# Altium footprint library General.PCBLIB: 231 footprints (part 5 of 15)
Each footprint in its own frame and in the unit in brackets; x right, y up, seen from the top. Pads: shape width x height; smd on the part's side, far side on the other; paste and mask are expansions set on the pad; w line width, h text height; cw(c..) or ccw(c..) is an arc to the next point about the centre after c.
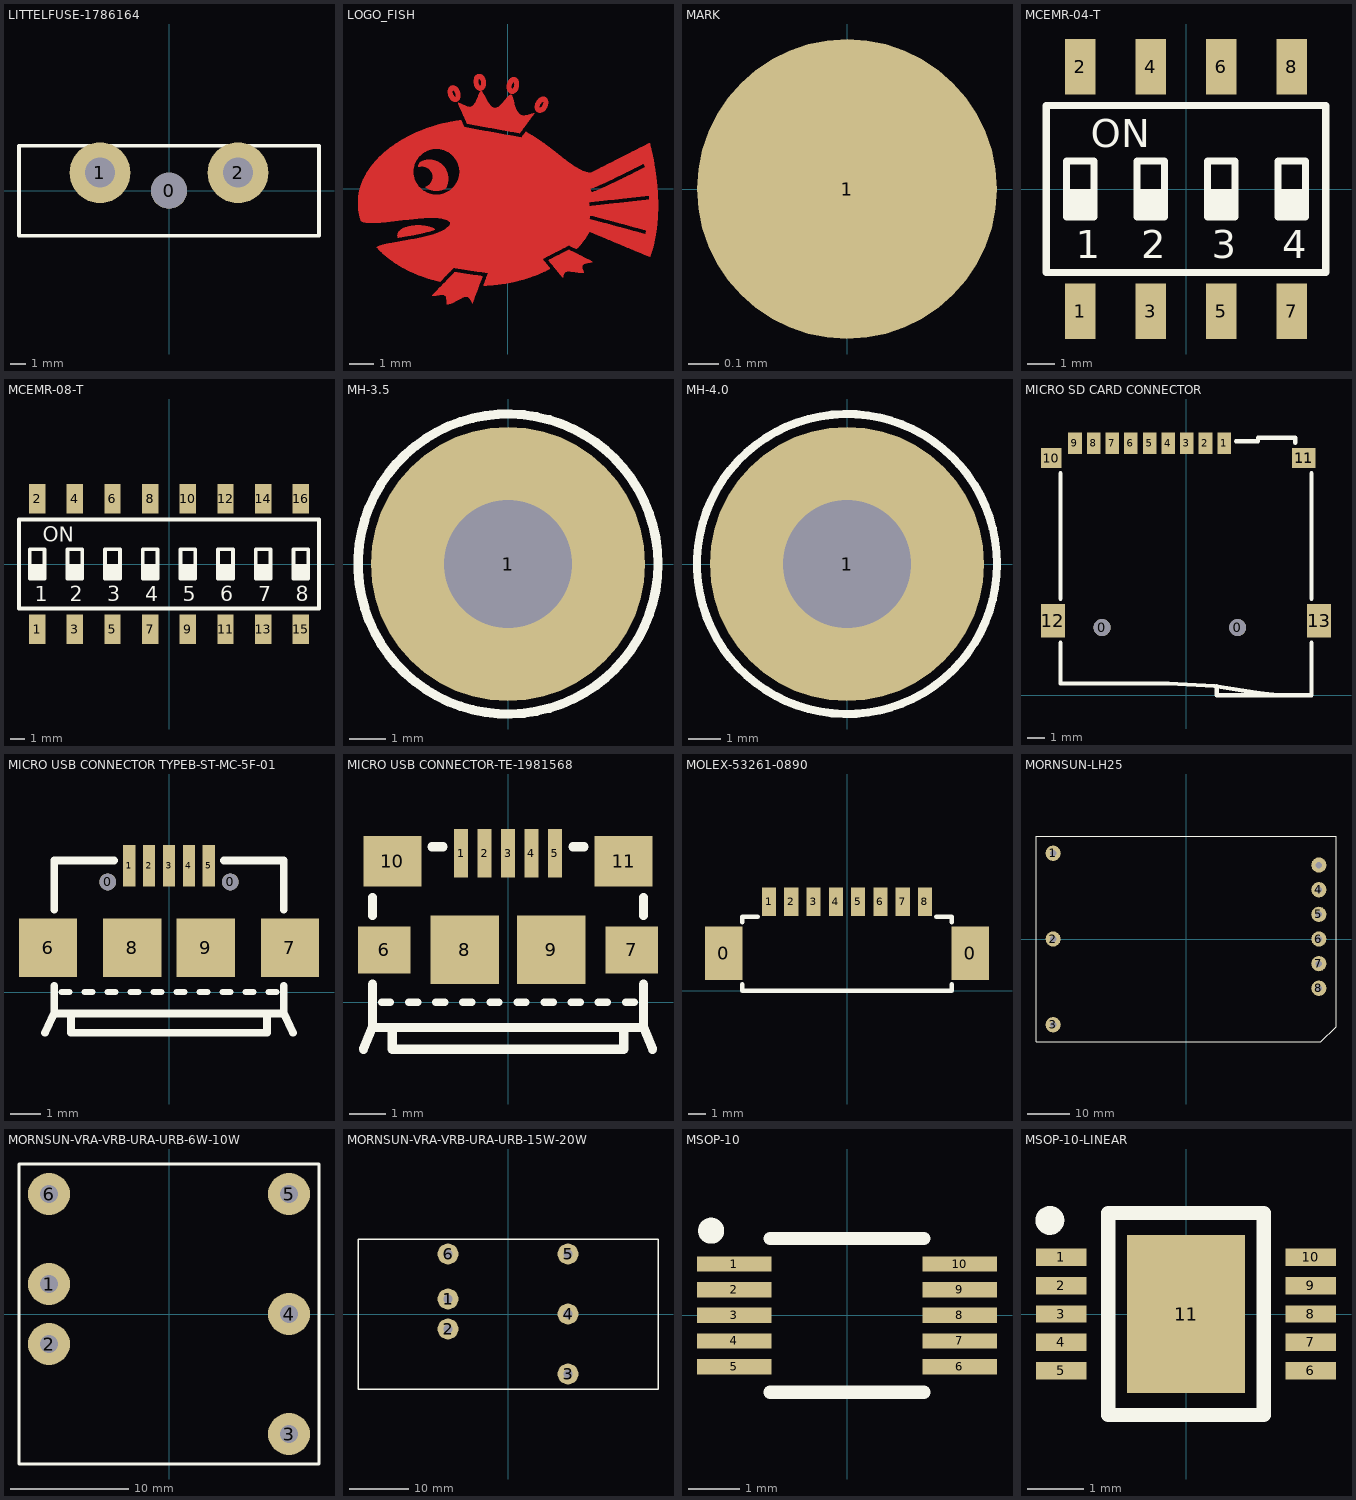
[diagram p4: the footprints below, top view; thin cyan lines are the x and y axes]

## LITTELFUSE-1786164 [mm] "Blade Fuse Holder"
height 26
pads (3):
  round 2.4 hole 2.4 unplated: 0(0,0)
  round 4.064 hole 2: 1(-4.6,1.2) 2(4.6,1.2)
Top Overlay:
  lines w0.254: -10,-3 -10,3 10,3 10,-3 -10,-3
3D body: height 17.5, standoff 0, extent -10,-3 10,3
3D body "ATO Blade Fuse.STEP": height 26, standoff 7.2, extent -9.525,-2.54 9.525,2.54

## LOGO_FISH [mm]
Top Layer:
  drawing of 2645 lines, arcs and shapes, not listed
Top Solder:
  drawing of 2645 lines, arcs and shapes, not listed

## MARK [mm] "Mark"
pads (1):
  round 1 smd mask+0.75: 1(0,0)

## MCEMR-04-T [mm] "DIP SWITCH"
height 3.8
pads (8):
  rect 1.1x2 smd: 1(-3.81,-4.4) 2(-3.81,4.4) 3(-1.27,-4.4) 4(-1.27,4.4) 5(1.27,-4.4) 6(1.27,4.4) 7(3.81,-4.4) 8(3.81,4.4)
Top Overlay:
  rectangle: 3.31,-1 4.31,0
  rectangle: 0.77,-1 1.77,0
  rectangle: -1.77,-1 -0.77,0
  rectangle: -4.31,-1 -3.31,0
  lines w0.254: -5.03,-3 -5.03,3 5.03,3 5.03,-3 -5.03,-3 ; -4.31,-1 -3.31,-1 -3.31,1 -4.31,1 -4.31,-1 ; -1.77,-1 -0.77,-1 -0.77,1 -1.77,1 -1.77,-1 ; 0.77,-1 1.77,-1 1.77,1 0.77,1 0.77,-1 ; 3.31,-1 4.31,-1 4.31,1 3.31,1 3.31,-1
  text "1" at -3.975,-2.5 h1.02
  text "2" at -1.613,-2.5 h1.02
  text "4" at 3.467,-2.5 h1.02
  text "3" at 0.927,-2.5 h1.02
  text "ON" at -3.42,1.5 h1.02
3D body "SMD_DIP-4_SWITCH.step": height 4.9, standoff 0, extent -5.55,-4.9 5.55,4.9

## MCEMR-08-T [mm] "DIP SWITCH"
height 3.8
pads (16):
  rect 1.1x2 smd: 1(-8.89,-4.4) 2(-8.89,4.4) 3(-6.35,-4.4) 4(-6.35,4.4) 5(-3.81,-4.4) 6(-3.81,4.4) 7(-1.27,-4.4) 8(-1.27,4.4) 9(1.27,-4.4) 10(1.27,4.4) 11(3.81,-4.4) 12(3.81,4.4) 13(6.35,-4.4) 14(6.35,4.4) 15(8.89,-4.4) 16(8.89,4.4)
Top Overlay:
  rectangle: 8.39,-1 9.39,0
  rectangle: 5.85,-1 6.85,0
  rectangle: 3.31,-1 4.31,0
  rectangle: 0.77,-1 1.77,0
  rectangle: -1.77,-1 -0.77,0
  rectangle: -4.31,-1 -3.31,0
  rectangle: -6.85,-1 -5.85,0
  rectangle: -9.39,-1 -8.39,0
  lines w0.254: -10.11,-3 -10.11,3 10.11,3 10.11,-3 -10.11,-3 ; -9.39,-1 -8.39,-1 -8.39,1 -9.39,1 -9.39,-1 ; -6.85,-1 -6.85,1 -5.85,1 -5.85,-1 -6.85,-1 ; -4.31,-1 -3.31,-1 -3.31,1 -4.31,1 -4.31,-1 ; -1.77,-1 -0.77,-1 -0.77,1 -1.77,1 -1.77,-1 ; 0.77,-1 1.77,-1 1.77,1 0.77,1 0.77,-1 ; 3.31,-1 4.31,-1 4.31,1 3.31,1 3.31,-1 ; 5.85,-1 6.85,-1 6.85,1 5.85,1 5.85,-1 ; 8.39,-1 9.39,-1 9.39,1 8.39,1 8.39,-1
  text "ON" at -8.5,1.5 h1.02
  text "8" at 8.547,-2.5 h1.02
  text "7" at 6.007,-2.5 h1.02
  text "6" at 3.467,-2.5 h1.02
  text "5" at 0.927,-2.5 h1.02
  text "4" at -1.613,-2.5 h1.02
  text "3" at -4.153,-2.5 h1.02
  text "2" at -6.693,-2.5 h1.02
  text "1" at -9.055,-2.5 h1.02
3D body "SW3dPS-219-8MST.STEP": height 4.24, standoff -0.01, extent -10.18,-4.955 10.184,4.955

## MH-3.5 [mm] "Mounting Hole"
pads (1):
  round 7.5 hole 3.5: 1(0,0)
Top Overlay:
  circle w0.254: c0,0 r4.1

## MH-4.0 [mm] "Mounting Hole"
pads (1):
  round 8.6 hole 4: 1(0,0)
Top Overlay:
  circle w0.254: c0,0 r4.7

## MICRO SD CARD CONNECTOR [mm] "Micro SD Card Connector"
height 1.8
pads (15):
  round 1 hole 1 unplated: 0(-4.95,4) 0(3.05,4)
  rect 0.8x1.27 smd: 1(2.25,14.865) 2(1.15,14.865) 3(0.05,14.865) 4(-1.05,14.865) 5(-2.15,14.865) 6(-3.25,14.865) 7(-4.35,14.865) 8(-5.45,14.865) 9(-6.55,14.865)
  rect 1.2x1.2 smd: 10(-7.95,14)
  rect 1.4x1.2 smd: 11(6.95,14)
  rect 1.4x2 smd: 12(-7.85,4.4) 13(7.85,4.4)
Top Overlay:
  lines w0.254: -7.4,3.1 -7.4,0.7 -1.02,0.7 1.68,0.55 4.34,0.12 5.42,0 ; -7.4,5.7 -7.4,13.1 ; 1.82,0.53 1.82,0 7.4,0 7.4,3.1 ; 2.95,15 4.25,15 4.25,15.2 6.45,15.2 6.45,14.9 ; 7.4,5.7 7.4,13.1
3D body "Micro SD Socket MEM2055-00-190-01-A_revG.STEP": height 1.92, standoff -0.52, extent -8.05,0 7.95,15.25

## MICRO USB CONNECTOR TYPEB-ST-MC-5F-01 [mm] "Micro USB Connector, Type B, ST-MC-5F-01"
height 2.35
pads (11):
  round 0.55 hole 0.55 unplated: 0(-2,3.6) 0(2,3.6)
  rect 0.4x1.35 smd: 1(-1.3,4.125) 2(-0.65,4.125) 3(0,4.125) 4(0.65,4.125) 5(1.3,4.125)
  rect 1.9x1.9 smd: 6(-3.95,1.45) 7(3.95,1.45) 8(-1.2,1.45) 9(1.2,1.45)
Top Overlay:
  lines w0.203: -3.5,0 -3.25,0 ; -2.75,0 -2.5,0 ; -2,0 -1.75,0 ; -1.25,0 -1,0 ; -0.5,0 -0.25,0 ; 0.25,0 0.5,0 ; 1,0 1.25,0 ; 1.75,0 2,0 ; 2.5,0 2.75,0 ; 3.25,0 3.5,0
  lines w0.254: -4.05,-1.33 -3.75,-0.7 ; -3.75,0.2 -3.75,0 -3.75,-0.7 ; -3.75,2.7 -3.75,4.3 -1.8,4.3 ; -3.2,-0.7 -3.2,-1.33 3.2,-1.33 3.2,-0.7 ; 1.8,4.3 3.75,4.3 3.75,2.7 ; 3.75,0.2 3.75,0 3.75,-0.7 ; 4.05,-1.33 3.75,-0.7 ; -3.75,-0.7 3.75,-0.7
3D body "Micro USB.STEP": height 2.72, standoff -0.22, extent -3.99,-1.13 3.99,4.3

## MICRO USB CONNECTOR-TE-1981568 [mm] "Micro USB Connector, TE, 1981568"
height 2.51
pads (11):
  rect 0.4x1.35 smd: 1(-1.3,4.125) 2(-0.65,4.125) 3(0,4.125) 4(0.65,4.125) 5(1.3,4.125)
  rect 1.45x1.3 smd: 6(-3.425,1.45) 7(3.425,1.45)
  rect 1.9x1.9 smd: 8(-1.2,1.45) 9(1.2,1.45)
  rect 1.6x1.4 smd: 10(-3.2,3.9) 11(3.2,3.9)
Top Overlay:
  lines w0.203: -3.5,0 -3.25,0 ; -2.75,0 -2.5,0 ; -2,0 -1.75,0 ; -1.25,0 -1,0 ; -0.5,0 -0.25,0 ; 0.25,0 0.5,0 ; 1,0 1.25,0 ; 1.75,0 2,0 ; 2.5,0 2.75,0 ; 3.25,0 3.5,0
  lines w0.254: -4,-1.3 -3.75,-0.7 ; -3.75,0.5 -3.75,0 -3.75,-0.7 ; -3.75,2.4 -3.75,2.9 ; -3.2,-0.7 -3.2,-1.3 3.2,-1.3 3.2,-0.7 ; -2.1,4.3 -1.8,4.3 ; 1.8,4.3 2.1,4.3 ; 3.75,0.5 3.75,0 3.75,-0.7 ; 3.75,2.4 3.75,2.9 ; 4,-1.3 3.75,-0.7 ; -3.75,-0.7 3.75,-0.7
3D body "Micro USB.STEP": height 2.72, standoff -0.22, extent -3.99,-1.13 3.99,4.3

## MOLEX-53261-0890 [mm] "1.25mm Connector, Molex, 53261-0890"
height 3.4
pads (10):
  rect 2.1x3 smd: 0(-6.925,2.1) 0(6.925,2.1)
  rect 0.8x1.6 smd: 1(-4.375,5) 2(-3.125,5) 3(-1.875,5) 4(-0.625,5) 5(0.625,5) 6(1.875,5) 7(3.125,5) 8(4.375,5)
Top Overlay:
  lines w0.254: -5.875,0.35 -5.875,0 5.875,0 5.875,0.35 ; -5.875,3.85 -5.875,4.15 -5,4.15 ; 5,4.15 5.875,4.15 5.875,3.85
3D body "53261-0890.step": height 3.4, standoff 0, extent -7.575,0 7.575,5.2

## MORNSUN-LH25 [mm] "AC-DC"
height 23.5
pads (9):
  round 3.556 hole 1.5: 1(-31,20) 2(-31,0) 3(-31,-20) 4(31,11.5) 5(31,5.75) 6(31,0) 7(31,-5.75) 8(31,-11.5) Trim(31,17.25)
Top Overlay:
  lines w0.254: -35,-24 31.5,-24 35,-20.5 35,24 -35,24 -35,-24
3D body: height 23.5, standoff 0, extent -35,-24 35,24

## MORNSUN-VRA-VRB-URA-URB-6W-10W [mil] "DC-DC"
height 460.63
pads (6):
  round 140 hole 59.06: 1(-400,100) 2(-400,-100) 3(400,-400) 4(400,0) 5(400,400) 6(-400,400)
Top Overlay:
  lines w10: -500,-500 500,-500 500,500 -500,500 -500,-500
3D body: height 460.63, standoff 0, extent -500,-500 500,500

## MORNSUN-VRA-VRB-URA-URB-15W-20W [mil] "DC-DC"
height 464.57
pads (6):
  round 140 hole 59.06: 1(-400,100) 2(-400,-100) 3(400,-400) 4(400,0) 5(400,400) 6(-400,400)
Top Overlay:
  lines w10: -1000,-500 -1000,500 1000,500 1000,-500 -1000,-500
3D body: height 464.57, standoff 0, extent -1000,-500 1000,500

## MSOP-10 [mm] "MSOP, 10PIN"
height 1.1
pads (10):
  rect 1.45x0.3 smd: 1(-2.2,1) 2(-2.2,0.5) 3(-2.2,0) 4(-2.2,-0.5) 5(-2.2,-1) 6(2.2,-1) 7(2.2,-0.5) 8(2.2,0) 9(2.2,0.5) 10(2.2,1)
Top Overlay:
  circle w0.254: c-2.65,1.65 r0.127
  lines w0.254: -1.5,-1.5 1.5,-1.5 ; -1.5,1.5 1.5,1.5
3D body "MSOP-10-LINEAR.STEP": height 1.1, standoff 0, extent -2.45,-1.5 2.45,1.5

## MSOP-10-LINEAR [mil] "MSOP, 10PIN, LINEAR"
height 43.31
pads (11):
  rect 35x12 smd: 1(-86.61,39.37) 2(-86.61,19.68) 3(-86.61,0) 4(-86.61,-19.68) 5(-86.61,-39.37) 6(86.61,-39.37) 7(86.61,-19.68) 8(86.61,0) 9(86.61,19.68) 10(86.61,39.37)
  rect 82x110 smd paste-18.5: 11(0,0)
Top Overlay:
  circle w10: c-94.49,64.96 r5
  lines w10: -53.94,-70.08 53.94,-70.08 53.94,70.08 -53.94,70.08 -53.94,-70.08
3D body "MSOP-10-LINEAR.STEP": height 43.28, standoff -0.03, extent -96.46,-59.06 96.46,59.06